# Altium footprint library komponenty_ITS_v1.PcbLib: 81 footprints (part 3 of 6) (continued)
## Mini-Flat_4 [mm] (continued)

## Mini-Flat_4_10mm [mm] "10mm version"
pads (4):
  rect 3x0.8 smd: 1(-4.5,1.27) 2(-4.5,-1.27) 3(4.5,-1.27) 4(4.5,1.27)
Top Overlay:
  circle w0.508: c-3.3,2.35 r0.105
  circle w0.508: c-1.25,1.95 r0.114
  lines w0.152: -1.829,-2.5 1.727,-2.5 1.727,2.5 -1.829,2.5 -1.829,-2.5
Mechanical 7:
  lines w0.2: -3,0 3,0
Top M11-12_SMOT:
  circle w0.508: c-1.9,1.3 r0.114
  rectangle: -4.15,-1.6 -2.45,-0.953
  rectangle: -4.15,0.95 -2.45,1.597
  region: 4.1,-0.953 2.4,-0.953 2.4,-1.6 4.1,-1.6
  region: 4.1,1.597 2.4,1.597 2.4,0.95 4.1,0.95
  lines w0.1: -2.45,-2.45 -2.45,2.45 2.45,2.45 2.45,-2.45 -2.45,-2.45
Top M13-14_SDES:
  text "'.Designator'" at -4.532,-0.333 h0.8
M15_orgin:
  lines w0.15: -1.194,0 0,0 ; 0,-1.194 0,0 ; 0,1.194 0,0 ; 1.194,0 0,0 ; -6.25,-2.55 -6.25,2.55 6.25,2.55 6.25,-2.55 -6.25,-2.55
3D body "Mini-FlatPackage_4.STEP": height 2, standoff -0.1, extent -3.525,-1.8 3.475,1.8

## PIN_HEADER_1x2_2.54_THT_A001 [mm]
pads (2):
  oval 1.6x1.8 hole 0.9: 1(-1.27,0) 2(1.27,0)
Top Overlay:
  lines w0.2: -2.603,0.893 -2.203,1.293 2.197,1.293 2.597,0.893 ; -2.6,-0.9 -2.2,-1.3 2.2,-1.3 2.6,-0.9
M15_orgin:
  lines w0.1: -1,0 0,0 ; 0,-1 0,0 ; 0,1 0,0 ; 0.009,0.004 1.009,0.004 ; -2.6,-1.3 2.6,-1.3 2.6,1.3 -2.6,1.3 -2.6,-1.3
Top M17-18_TDES:
  text "'.Designator'" at -5.465,2.483 h1
Top M19-20_TMOT:
  circle w0.3: c-2.1,-0.7 r0.15
  lines w0.15: 2.578,-0.823 2.102,-1.3 0.6,-1.3 0,-0.7 -0.6,-1.3 -2.2,-1.3 -2.6,-0.9 -2.6,0.823 -2.123,1.3 -0.6,1.3 0,0.7 0.6,1.3 2.2,1.3 2.579,0.921 2.579,-0.823 ; -1.708,-0.412 -1.708,0.388 ; -1.708,-0.412 -0.908,0.388 ; -1.708,-0.412 -0.908,-0.412 ; -1.708,0.388 -0.908,-0.412 ; -1.708,0.388 -0.908,0.388 ; -0.908,-0.412 -0.908,0.388 ; 0.875,-0.406 0.875,0.394 ; 0.875,-0.406 1.675,0.394 ; 0.875,-0.406 1.675,-0.406 ; 0.875,0.394 1.675,-0.406 ; 0.875,0.394 1.675,0.394 ; 1.675,-0.406 1.675,0.394 ; -2.8,-1.5 2.8,-1.5 2.8,1.5 -2.8,1.5 -2.8,-1.5
3D body "pin_header_1x2_2mm_THT.stp": height 8.55, standoff -2.99, extent -2.54,-1.27 2.54,1.27

## PIN_HEADER_1x2_2_THT_A001 [mm]
pads (2):
  oval 1.5x1.7 hole 0.8: 1(-1,0) 2(1,0)
Top Overlay:
  lines w0.2: -2.2,-0.5 -2.2,0.6 ; 2.2,-0.5 2.2,0.6
M15_orgin:
  lines w0.1: -2.204,-0.999 2.196,-0.999 ; -2.2,-0.995 -2.2,1 2.2,1 2.2,-0.995 ; -1,0 0,0 ; 0,-1 0,0 ; 0,1 0,0 ; 0.009,0.004 1.009,0.004
Top M17-18_TDES:
  text "'.Designator'" at -5.565,1.733 h1
Top M19-20_TMOT:
  circle w0.3: c-1.1,-1.4 r0.15
  lines w0.15: -1.4,-0.4 -1.4,0.4 ; -1.4,-0.4 -0.6,0.4 ; -1.4,-0.4 -0.6,-0.4 ; -1.4,0.4 -0.6,-0.4 ; -1.4,0.4 -0.6,0.4 ; -0.6,-0.4 -0.6,0.4 ; 0.6,-0.4 0.6,0.4 ; 0.6,-0.4 1.4,0.4 ; 0.6,-0.4 1.4,-0.4 ; 0.6,0.4 1.4,-0.4 ; 0.6,0.4 1.4,0.4 ; 1.4,-0.4 1.4,0.4 ; -2.15,-0.75 -2.15,0.75 -1.95,0.95 -0.25,0.95 0,0.7 0.25,0.95 1.9,0.95 2.15,0.7 2.15,-0.7 1.9,-0.95 0.25,-0.95 0,-0.7 -0.25,-0.95 -1.95,-0.95 -2.15,-0.75
3D body "2pin_jumper_62000211121.stp": height 6.01, standoff -2.69, extent -2,-1 2,1

## PWSON-10 [mm]
height 0.8
pads (19):
  rrect50% 0.28x0.9 smd: 1(-1,-1.55) 2(-0.5,-1.55) 3(0,-1.55) 4(0.5,-1.55) 5(1,-1.55) 6(1,1.55) 7(0.5,1.55) 8(0,1.55) 9(-0.5,1.55) 10(-1,1.55)
  rect 0.7x0.25 smd paste-0.2: EP1(-1.5,0.6) EP2(-1.5,0.2) EP3(-1.5,-0.2) EP4(-1.5,-0.6) EP5(1.5,-0.6) EP6(1.5,-0.2) EP7(1.5,0.2) EP8(1.5,0.6)
  rect 2.35x1.7 smd paste-1.2: EP9(0,0)
Top Overlay:
  circle w0.25: c-1.7,-2.3 r0.125
  lines w0.2: -1.725,-1.29 -1.725,-1.725 -1.54,-1.725 ; -1.725,1.29 -1.725,1.725 -1.54,1.725 ; 1.54,-1.725 1.725,-1.725 1.725,-1.29 ; 1.54,1.725 1.725,1.725 1.725,1.29
Top Paste:
  rectangle: -1.79,-0.719 -1.204,-0.477
  rectangle: -1.79,-0.319 -1.204,-0.077
  rectangle: -1.79,0.081 -1.204,0.323
  rectangle: -1.79,0.481 -1.204,0.723
  rectangle: 1.21,-0.719 1.796,-0.477
  rectangle: 1.21,-0.319 1.796,-0.077
  rectangle: 1.21,0.081 1.796,0.323
  rectangle: 1.21,0.481 1.796,0.723
  rectangle: -0.988,-0.7 -0.1,-0.1
  region: 0.988,0.7 0.1,0.7 0.1,0.1 0.988,0.1
  region: 0.988,-0.1 0.1,-0.1 0.1,-0.7 0.988,-0.7
  rectangle: -0.988,0.1 -0.1,0.7
Top Solder:
  rectangle: -1.149,0.638 1.177,1.406
  rectangle: -1.174,-1.243 1.168,-0.676
  rectangle: -1,-2.1 1,-1
  rectangle: -1,1 1,2.1
  lines w0.2: -1.594,-0.725 cw(c-1.594,-1.175) -1.144,-1.175 ; -1.589,0.722 ccw(c-1.589,1.172) -1.139,1.172 ; 1.139,-1.172 cw(c1.589,-1.172) 1.589,-0.722 ; 1.141,1.186 ccw(c1.591,1.186) 1.591,0.736
Top M11-12_SMOT:
  circle w0.25: c-1.292,-1.025 r0.125
  region: -0.317,-1.381 -0.688,-1.381 -0.688,-1.6 -0.317,-1.6
  region: -0.817,-1.381 -1.188,-1.381 -1.188,-1.6 -0.817,-1.6
  region: -1.474,-0.32 -1.474,-0.071 -1.692,-0.071 -1.692,-0.32
  region: -1.474,-0.72 -1.474,-0.471 -1.692,-0.471 -1.692,-0.72
  rectangle: -1.183,1.381 -0.812,1.6
  rectangle: -0.683,1.381 -0.312,1.6
  region: -1.474,0.48 -1.474,0.729 -1.692,0.729 -1.692,0.48
  region: -1.474,0.08 -1.474,0.329 -1.692,0.329 -1.692,0.08
  region: 1.183,-1.381 0.812,-1.381 0.812,-1.6 1.183,-1.6
  region: 0.683,-1.381 0.312,-1.381 0.312,-1.6 0.683,-1.6
  region: 1.474,-0.08 1.474,-0.329 1.692,-0.329 1.692,-0.08
  region: 1.474,-0.48 1.474,-0.729 1.692,-0.729 1.692,-0.48
  rectangle: 0.317,1.381 0.688,1.6
  rectangle: 0.817,1.381 1.188,1.6
  region: 1.474,0.72 1.474,0.471 1.692,0.471 1.692,0.72
  region: 1.474,0.32 1.474,0.071 1.692,0.071 1.692,0.32
  region: 0.183,-1.381 -0.188,-1.381 -0.188,-1.6 0.183,-1.6
  rectangle: -0.183,1.381 0.188,1.6
  lines w0.1: -1.7,-1.6 -1.7,1.6 1.7,1.6 1.7,-1.6 -1.7,-1.6
Top M13-14_SDES:
  text "'.Designator'" at -4.532,-0.333 h0.8
M15_orgin:
  lines w0.1: -0.5,0 0.5,0 ; 0,-0.5 0,0.5 ; -1.575,-1.575 -1.575,1.575 1.575,1.575 1.575,-1.575 -1.575,-1.575
3D body "PWSON-10.step": height 0.8, standoff 0, extent -1.576,-1.576 1.576,1.576

## QFN48_5_5_v1 [mm] "QFN48 5x5"
height 0.9
pads (49):
  oval 0.8x0.2 smd: 1(-2.425,2.275) 2(-2.425,1.925) 3(-2.425,1.575) 4(-2.425,1.225) 5(-2.425,0.875) 6(-2.425,0.525) 7(-2.425,0.175) 8(-2.425,-0.175) 9(-2.425,-0.525) 10(-2.425,-0.875) 11(-2.425,-1.225) 12(-2.425,-1.575) 13(-2.425,-1.925) 14(-2.425,-2.275) 25(2.425,-2.275) 26(2.425,-1.925) 27(2.425,-1.575) 28(2.425,-1.225) 29(2.425,-0.875) 30(2.425,-0.525) 31(2.425,-0.175) 32(2.425,0.175) 33(2.425,0.525) 34(2.425,0.875) 35(2.425,1.225) 36(2.425,1.575) 37(2.425,1.925) 38(2.425,2.275)
  oval 0.2x0.8 smd: 15(-1.575,-2.425) 16(-1.225,-2.425) 17(-0.875,-2.425) 18(-0.525,-2.425) 19(-0.175,-2.425) 20(0.175,-2.425) 21(0.525,-2.425) 22(0.875,-2.425) 23(1.225,-2.425) 24(1.575,-2.425)
  oval 0.2x0.8 smd paste-0.1: 39(1.575,2.425) 40(1.225,2.425) 41(0.875,2.425) 42(0.525,2.425) 43(0.175,2.425) 44(-0.175,2.425) 45(-0.525,2.425) 46(-0.875,2.425) 47(-1.225,2.425) 48(-1.575,2.425)
  rect 3.7x3.7 smd paste-1.85: 49(0,0)
Top Overlay:
  circle w0.25: c-2.975,2.975 r0.125
Top Paste:
  rectangle: -1.6,0.2 -0.2,1.6
  region: -0.21,-1.593 -0.21,-0.193 -1.61,-0.193 -1.61,-1.593
  region: 1.584,-0.187 0.184,-0.187 0.184,-1.587 1.584,-1.587
  region: 0.2,1.6 0.2,0.2 1.6,0.2 1.6,1.6
  lines w0.2: -1.576,2.42 -1.576,2.72 ; -1.224,2.13 -1.224,2.43 ; -0.876,2.42 -0.876,2.72 ; -0.524,2.13 -0.524,2.43 ; -0.176,2.42 -0.176,2.72 ; 0.176,2.13 0.176,2.43 ; 0.524,2.42 0.524,2.72 ; 0.876,2.13 0.876,2.43 ; 1.224,2.42 1.224,2.72 ; 1.576,2.13 1.576,2.43
Top M11-12_SMOT:
  circle w0.2: c-1.625,1.625 r0.2
  rectangle: -1.65,2.15 -1.5,2.603
  rectangle: -1.3,2.15 -1.15,2.603
  rectangle: -0.95,2.15 -0.8,2.603
  rectangle: -0.6,2.15 -0.45,2.603
  rectangle: -0.25,2.15 -0.1,2.603
  rectangle: 0.1,2.15 0.25,2.603
  rectangle: 0.45,2.15 0.6,2.603
  rectangle: 0.8,2.15 0.95,2.603
  rectangle: 1.15,2.15 1.3,2.603
  rectangle: 1.5,2.15 1.65,2.603
  region: 2.15,2.35 2.15,2.2 2.603,2.2 2.603,2.35
  region: 2.15,2 2.15,1.85 2.603,1.85 2.603,2
  region: 2.15,1.65 2.15,1.5 2.603,1.5 2.603,1.65
  region: 2.15,1.3 2.15,1.15 2.603,1.15 2.603,1.3
  region: 2.15,0.95 2.15,0.8 2.603,0.8 2.603,0.95
  region: 2.15,0.6 2.15,0.45 2.603,0.45 2.603,0.6
  region: 2.15,0.25 2.15,0.1 2.603,0.1 2.603,0.25
  region: 2.15,-0.1 2.15,-0.25 2.603,-0.25 2.603,-0.1
  region: 2.15,-0.45 2.15,-0.6 2.603,-0.6 2.603,-0.45
  region: 2.15,-0.8 2.15,-0.95 2.603,-0.95 2.603,-0.8
  region: 2.15,-1.15 2.15,-1.3 2.603,-1.3 2.603,-1.15
  region: 2.15,-1.5 2.15,-1.65 2.603,-1.65 2.603,-1.5
  region: 2.15,-1.85 2.15,-2 2.603,-2 2.603,-1.85
  region: 2.15,-2.2 2.15,-2.35 2.603,-2.35 2.603,-2.2
  region: 1.65,-2.15 1.5,-2.15 1.5,-2.603 1.65,-2.603
  region: 1.3,-2.15 1.15,-2.15 1.15,-2.603 1.3,-2.603
  region: 0.95,-2.15 0.8,-2.15 0.8,-2.603 0.95,-2.603
  region: 0.6,-2.15 0.45,-2.15 0.45,-2.603 0.6,-2.603
  region: 0.25,-2.15 0.1,-2.15 0.1,-2.603 0.25,-2.603
  region: -0.1,-2.15 -0.25,-2.15 -0.25,-2.603 -0.1,-2.603
  region: -0.45,-2.15 -0.6,-2.15 -0.6,-2.603 -0.45,-2.603
  region: -0.8,-2.15 -0.95,-2.15 -0.95,-2.603 -0.8,-2.603
  region: -1.15,-2.15 -1.3,-2.15 -1.3,-2.603 -1.15,-2.603
  region: -1.5,-2.15 -1.65,-2.15 -1.65,-2.603 -1.5,-2.603
  region: -2.15,-2.35 -2.15,-2.2 -2.603,-2.2 -2.603,-2.35
  region: -2.15,-2 -2.15,-1.85 -2.603,-1.85 -2.603,-2
  region: -2.15,-1.65 -2.15,-1.5 -2.603,-1.5 -2.603,-1.65
  region: -2.15,-1.3 -2.15,-1.15 -2.603,-1.15 -2.603,-1.3
  region: -2.15,-0.95 -2.15,-0.8 -2.603,-0.8 -2.603,-0.95
  region: -2.15,-0.6 -2.15,-0.45 -2.603,-0.45 -2.603,-0.6
  region: -2.15,-0.25 -2.15,-0.1 -2.603,-0.1 -2.603,-0.25
  region: -2.15,0.1 -2.15,0.25 -2.603,0.25 -2.603,0.1
  region: -2.15,0.45 -2.15,0.6 -2.603,0.6 -2.603,0.45
  region: -2.15,0.8 -2.15,0.95 -2.603,0.95 -2.603,0.8
  region: -2.15,1.15 -2.15,1.3 -2.603,1.3 -2.603,1.15
  region: -2.15,1.5 -2.15,1.65 -2.603,1.65 -2.603,1.5
  region: -2.15,1.85 -2.15,2 -2.603,2 -2.603,1.85
  region: -2.15,2.2 -2.15,2.35 -2.603,2.35 -2.603,2.2
  lines w0.1: -2.6,-2.6 -2.6,2.6 2.6,2.6 2.6,-2.6 -2.6,-2.6
Top M13-14_SDES:
  text "'.Designator'" at -4.532,-0.333 h0.8
M15_orgin:
  lines w0.05: -3.075,-3.075 -3.075,3.075 3.075,3.075 3.075,-3.075 -3.075,-3.075
  lines w0.1: -0.5,0 0.5,0 ; 0,-0.5 0,0.5
3D body "QFN48_5_5_v1.step": height 0.9, standoff 0, extent -2.575,-2.575 2.575,2.575

## QFN64_A001 [mm] "GECO SILICON LABS"
height 0.8
pads (65):
  rrect50% 0.8x0.25 smd paste-0.126: 1(-4.425,3.75) 16(-4.425,-3.75) 33(4.425,-3.75) 48(4.425,3.75)
  rrect50% 0.85x0.25 smd paste-0.126: 2(-4.4,3.25) 3(-4.4,2.75) 4(-4.4,2.25) 5(-4.4,1.75) 6(-4.4,1.25) 7(-4.4,0.75) 8(-4.4,0.25) 9(-4.4,-0.25) 10(-4.4,-0.75) 11(-4.4,-1.25) 12(-4.4,-1.75) 13(-4.4,-2.25) 14(-4.4,-2.75) 15(-4.4,-3.25) 34(4.4,-3.25) 35(4.4,-2.75) 36(4.4,-2.25) 37(4.4,-1.75) 38(4.4,-1.25) 39(4.4,-0.75) 40(4.4,-0.25) 41(4.4,0.25) 42(4.4,0.75) 43(4.4,1.25) 44(4.4,1.75) 45(4.4,2.25) 46(4.4,2.75) 47(4.4,3.25)
  rrect50% 0.25x0.8 smd paste-0.126: 17(-3.75,-4.425) 32(3.75,-4.425) 49(3.75,4.425) 64(-3.75,4.425)
  rrect50% 0.25x0.85 smd paste-0.126: 18(-3.25,-4.4) 19(-2.75,-4.4) 20(-2.25,-4.4) 21(-1.75,-4.4) 22(-1.25,-4.4) 23(-0.75,-4.4) 24(-0.25,-4.4) 25(0.25,-4.4) 26(0.75,-4.4) 27(1.25,-4.4) 28(1.75,-4.4) 29(2.25,-4.4) 30(2.75,-4.4) 31(3.25,-4.4) 50(3.25,4.4) 51(2.75,4.4) 52(2.25,4.4) 53(1.75,4.4) 54(1.25,4.4) 55(0.75,4.4) 56(0.25,4.4) 57(-0.25,4.4) 58(-0.75,4.4) 59(-1.25,4.4) 60(-1.75,4.4) 61(-2.25,4.4) 62(-2.75,4.4) 63(-3.25,4.4)
  rect 7.2x7.2 smd paste-3.7: 65(0,0)
Top Overlay:
  circle w0.25: c-5.3,4.5 r0.125
  lines w0.2: -4.65,-4.275 -4.65,-4.65 -4.275,-4.65 ; -4.65,4.275 -4.65,4.65 -4.275,4.65 ; 4.275,-4.65 4.65,-4.65 4.65,-4.275 ; 4.275,4.65 4.65,4.65 4.65,4.275
Top Paste:
  drawing of 70 lines, arcs and shapes, not listed
Top M11-12_SMOT:
  circle w0.2: c-3.5,3.5 r0.2
  rectangle: -3.842,4.138 -3.67,4.591
  rectangle: -3.34,4.134 -3.168,4.587
  rectangle: -2.84,4.134 -2.668,4.587
  rectangle: -2.34,4.134 -2.168,4.587
  rectangle: -1.84,4.134 -1.668,4.587
  rectangle: -1.34,4.134 -1.168,4.587
  rectangle: -0.84,4.134 -0.668,4.587
  rectangle: -0.34,4.134 -0.168,4.587
  rectangle: 0.16,4.134 0.332,4.587
  rectangle: 0.66,4.134 0.832,4.587
  rectangle: 1.16,4.134 1.332,4.587
  rectangle: 1.66,4.134 1.832,4.587
  rectangle: 2.16,4.134 2.332,4.587
  rectangle: 2.66,4.134 2.832,4.587
  rectangle: 3.16,4.134 3.332,4.587
  rectangle: 3.667,4.137 3.838,4.59
  region: -4.138,-3.842 -4.138,-3.67 -4.591,-3.67 -4.591,-3.842
  region: -4.134,-3.34 -4.134,-3.168 -4.587,-3.168 -4.587,-3.34
  region: -4.134,-2.84 -4.134,-2.668 -4.587,-2.668 -4.587,-2.84
  region: -4.134,-2.34 -4.134,-2.168 -4.587,-2.168 -4.587,-2.34
  region: -4.134,-1.84 -4.134,-1.668 -4.587,-1.668 -4.587,-1.84
  region: -4.134,-1.34 -4.134,-1.168 -4.587,-1.168 -4.587,-1.34
  region: -4.134,-0.84 -4.134,-0.668 -4.587,-0.668 -4.587,-0.84
  region: -4.134,-0.34 -4.134,-0.168 -4.587,-0.168 -4.587,-0.34
  region: -4.134,0.16 -4.134,0.332 -4.587,0.332 -4.587,0.16
  region: -4.134,0.66 -4.134,0.832 -4.587,0.832 -4.587,0.66
  region: -4.134,1.16 -4.134,1.332 -4.587,1.332 -4.587,1.16
  region: -4.134,1.66 -4.134,1.832 -4.587,1.832 -4.587,1.66
  region: -4.134,2.16 -4.134,2.332 -4.587,2.332 -4.587,2.16
  region: -4.134,2.66 -4.134,2.832 -4.587,2.832 -4.587,2.66
  region: -4.134,3.16 -4.134,3.332 -4.587,3.332 -4.587,3.16
  region: -4.137,3.667 -4.137,3.838 -4.59,3.838 -4.59,3.667
  region: 3.842,-4.138 3.67,-4.138 3.67,-4.591 3.842,-4.591
  region: 3.34,-4.134 3.168,-4.134 3.168,-4.587 3.34,-4.587
  region: 2.84,-4.134 2.668,-4.134 2.668,-4.587 2.84,-4.587
  region: 2.34,-4.134 2.168,-4.134 2.168,-4.587 2.34,-4.587
  region: 1.84,-4.134 1.668,-4.134 1.668,-4.587 1.84,-4.587
  region: 1.34,-4.134 1.168,-4.134 1.168,-4.587 1.34,-4.587
  region: 0.84,-4.134 0.668,-4.134 0.668,-4.587 0.84,-4.587
  region: 0.34,-4.134 0.168,-4.134 0.168,-4.587 0.34,-4.587
  region: -0.16,-4.134 -0.332,-4.134 -0.332,-4.587 -0.16,-4.587
  region: -0.66,-4.134 -0.832,-4.134 -0.832,-4.587 -0.66,-4.587
  region: -1.16,-4.134 -1.332,-4.134 -1.332,-4.587 -1.16,-4.587
  region: -1.66,-4.134 -1.832,-4.134 -1.832,-4.587 -1.66,-4.587
  region: -2.16,-4.134 -2.332,-4.134 -2.332,-4.587 -2.16,-4.587
  region: -2.66,-4.134 -2.832,-4.134 -2.832,-4.587 -2.66,-4.587
  region: -3.16,-4.134 -3.332,-4.134 -3.332,-4.587 -3.16,-4.587
  region: -3.667,-4.137 -3.838,-4.137 -3.838,-4.59 -3.667,-4.59
  region: 4.138,3.842 4.138,3.67 4.591,3.67 4.591,3.842
  region: 4.134,3.34 4.134,3.168 4.587,3.168 4.587,3.34
  region: 4.134,2.84 4.134,2.668 4.587,2.668 4.587,2.84
  region: 4.134,2.34 4.134,2.168 4.587,2.168 4.587,2.34
  region: 4.134,1.84 4.134,1.668 4.587,1.668 4.587,1.84
  region: 4.134,1.34 4.134,1.168 4.587,1.168 4.587,1.34
  region: 4.134,0.84 4.134,0.668 4.587,0.668 4.587,0.84
  region: 4.134,0.34 4.134,0.168 4.587,0.168 4.587,0.34
  region: 4.134,-0.16 4.134,-0.332 4.587,-0.332 4.587,-0.16
  region: 4.134,-0.66 4.134,-0.832 4.587,-0.832 4.587,-0.66
  region: 4.134,-1.16 4.134,-1.332 4.587,-1.332 4.587,-1.16
  region: 4.134,-1.66 4.134,-1.832 4.587,-1.832 4.587,-1.66
  region: 4.134,-2.16 4.134,-2.332 4.587,-2.332 4.587,-2.16
  region: 4.134,-2.66 4.134,-2.832 4.587,-2.832 4.587,-2.66
  region: 4.134,-3.16 4.134,-3.332 4.587,-3.332 4.587,-3.16
  region: 4.137,-3.667 4.137,-3.838 4.59,-3.838 4.59,-3.667
  lines w0.1: -4.5,-4.5 4.5,-4.5 4.5,4.5 -4.5,4.5 -4.5,-4.5
Top M13-14_SDES:
  text "'.Designator'" at -4.532,-0.333 h0.8
M15_orgin:
  lines w0.05: -5,-5 -5,5 5,5 5,-5 -5,-5
  lines w0.1: -0.5,0 0.5,0 ; 0,-0.5 0,0.5
3D body "QFN64_A001.step": height 0.8, standoff 0, extent -4.55,-4.55 4.55,4.55

## QFN_16_3x3_A001 [mm] "CMOSTEK"
height 0.8
pads (17):
  oval 0.7x0.25 smd paste-0.05 mask+0.1: 1(-1.35,0.75) 2(-1.35,0.25) 3(-1.35,-0.25) 4(-1.35,-0.75) 9(1.35,-0.75) 10(1.35,-0.25) 11(1.35,0.25) 12(1.35,0.75)
  oval 0.25x0.7 smd paste-0.05 mask+0.1: 5(-0.75,-1.35) 6(-0.25,-1.35) 7(0.25,-1.35) 8(0.75,-1.35) 13(0.75,1.35) 14(0.25,1.35) 15(-0.25,1.35) 16(-0.75,1.35)
  rect 1.6x1.6 smd paste-0.1 mask+0.1: 17(0,0)
Top Overlay:
  circle w0.25: c-2.35,1.55 r0.125
  lines w0.2: -1.7,-1.275 -1.7,-1.7 -1.275,-1.7 ; -1.7,1.275 -1.7,1.7 -1.275,1.7 ; 1.275,-1.7 1.7,-1.7 1.7,-1.275 ; 1.275,1.7 1.7,1.7 1.7,1.275
Top Solder:
  rectangle: 0.8,-0.8 1.8,0.8
  region: 0.8,0.8 0.8,1.8 -0.8,1.8 -0.8,0.8
  region: -0.8,0.8 -1.8,0.8 -1.8,-0.8 -0.8,-0.8
  region: -0.8,-0.8 -0.8,-1.8 0.8,-1.8 0.8,-0.8
  region: 0.974,1.118 0.974,1.114 0.976,1.088 0.997,1.038 1.035,1.001 1.084,0.98 1.111,0.978 1.1,0.978 1.1,0.7 0.6,0.7 0.6,1.119
  region: -1.118,0.974 -1.114,0.974 -1.088,0.976 -1.038,0.997 -1.001,1.035 -0.98,1.084 -0.978,1.111 -0.978,1.1 -0.7,1.1 -0.7,0.6 -1.119,0.6
  region: -0.974,-1.118 -0.974,-1.114 -0.976,-1.088 -0.997,-1.038 -1.035,-1.001 -1.084,-0.98 -1.111,-0.978 -1.1,-0.978 -1.1,-0.7 -0.6,-0.7 -0.6,-1.119
  region: 1.118,-0.974 1.114,-0.974 1.088,-0.976 1.038,-0.997 1.001,-1.035 0.98,-1.084 0.978,-1.111 0.978,-1.1 0.7,-1.1 0.7,-0.6 1.119,-0.6
Top M11-12_SMOT:
  circle w0.25: c-1.2,1.2 r0.125
  rectangle: -0.85,1.24 -0.65,1.575
  rectangle: -0.35,1.24 -0.15,1.575
  rectangle: 0.15,1.24 0.35,1.575
  rectangle: 0.65,1.24 0.85,1.575
  region: 1.24,0.85 1.24,0.65 1.575,0.65 1.575,0.85
  region: 1.24,0.35 1.24,0.15 1.575,0.15 1.575,0.35
  region: 1.24,-0.15 1.24,-0.35 1.575,-0.35 1.575,-0.15
  region: 1.24,-0.65 1.24,-0.85 1.575,-0.85 1.575,-0.65
  region: 0.85,-1.24 0.65,-1.24 0.65,-1.575 0.85,-1.575
  region: 0.35,-1.24 0.15,-1.24 0.15,-1.575 0.35,-1.575
  region: -0.15,-1.24 -0.35,-1.24 -0.35,-1.575 -0.15,-1.575
  region: -0.65,-1.24 -0.85,-1.24 -0.85,-1.575 -0.65,-1.575
  region: -1.24,-0.85 -1.24,-0.65 -1.575,-0.65 -1.575,-0.85
  region: -1.24,-0.35 -1.24,-0.15 -1.575,-0.15 -1.575,-0.35
  region: -1.24,0.15 -1.24,0.35 -1.575,0.35 -1.575,0.15
  region: -1.24,0.65 -1.24,0.85 -1.575,0.85 -1.575,0.65
  lines w0.2: -1.6,-1.6 1.6,-1.6 1.6,1.6 -1.6,1.6 -1.6,-1.6
Top M13-14_SDES:
  text "'.Designator'" at -4.532,-0.333 h0.8
M15_orgin:
  lines w0.05: -2.1,-2.1 2.1,-2.1 2.1,2.1 -2.1,2.1 -2.1,-2.1
  lines w0.1: -0.5,0 0.5,0 ; 0,-0.5 0,0.5
3D body "QFN_16_3x3_A001.step": height 0.8, standoff 0, extent -1.6,-1.6 1.6,1.6

## QFN_48_7x7_A001B [mm] "ST"
height 0.8
pads (49):
  rrect50% 0.55x0.3 smd paste-0.035 mask+0.1: 1(-3.375,2.75) 2(-3.375,2.25) 3(-3.375,1.75) 4(-3.375,1.25) 5(-3.375,0.75) 6(-3.375,0.25) 7(-3.375,-0.25) 8(-3.375,-0.75) 9(-3.375,-1.25) 10(-3.375,-1.75) 11(-3.375,-2.25) 12(-3.375,-2.75) 25(3.375,-2.75) 26(3.375,-2.25) 27(3.375,-1.75) 28(3.375,-1.25) 29(3.375,-0.75) 30(3.375,-0.25) 31(3.375,0.25) 32(3.375,0.75) 33(3.375,1.25) 34(3.375,1.75) 35(3.375,2.25) 36(3.375,2.75)
  rrect50% 0.3x0.55 smd paste-0.035 mask+0.1: 13(-2.75,-3.375) 14(-2.25,-3.375) 15(-1.75,-3.375) 16(-1.25,-3.375) 17(-0.75,-3.375) 18(-0.25,-3.375) 19(0.25,-3.375) 20(0.75,-3.375) 21(1.25,-3.375) 22(1.75,-3.375) 23(2.25,-3.375) 24(2.75,-3.375) 37(2.75,3.375) 38(2.25,3.375) 39(1.75,3.375) 40(1.25,3.375) 41(0.75,3.375) 42(0.25,3.375) 43(-0.25,3.375) 44(-0.75,3.375) 45(-1.25,3.375) 46(-1.75,3.375) 47(-2.25,3.375) 48(-2.75,3.375)
  rect 5.5x5.5 smd paste-2.75 mask+0.1: 49(0,0)
Top Overlay:
  circle w0.25: c-4.215,3.496 r0.125
  lines w0.2: -3.713,3.325 -3.713,3.75 -3.288,3.75 ; -3.7,-3.275 -3.7,-3.7 -3.275,-3.7 ; 3.287,-3.75 3.712,-3.75 3.712,-3.325 ; 3.325,3.712 3.75,3.712 3.75,3.287
Top Paste:
  region: -0.75,0.75 -0.75,-0.75 0.75,-0.75 0.75,0.75
  region: 1.25,0.75 1.25,-0.75 2.5,-0.75 2.5,0.75
  region: 0.75,-1.25 -0.75,-1.25 -0.75,-2.5 0.75,-2.5
  region: -1.25,-0.75 -1.25,0.75 -2.5,0.75 -2.5,-0.75
  rectangle: -0.75,1.25 0.75,2.5
  region: 1.25,2.5 1.25,1.25 2.5,1.25 2.5,2.5
  region: 2.5,-1.25 1.25,-1.25 1.25,-2.5 2.5,-2.5
  region: -1.25,-2.5 -1.25,-1.25 -2.5,-1.25 -2.5,-2.5
  rectangle: -2.5,1.25 -1.25,2.5
Top Solder:
  region: -0.8,-0.8 -0.8,-1.8 0.8,-1.8 0.8,-0.8
  region: -0.8,0.8 -1.8,0.8 -1.8,-0.8 -0.8,-0.8
  region: 0.8,0.8 0.8,1.8 -0.8,1.8 -0.8,0.8
  rectangle: 0.8,-0.8 1.8,0.8
  region: 1.118,-0.974 1.114,-0.974 1.088,-0.976 1.038,-0.997 1.001,-1.035 0.98,-1.084 0.978,-1.111 0.978,-1.1 0.7,-1.1 0.7,-0.6 1.119,-0.6
  region: -0.974,-1.118 -0.974,-1.114 -0.976,-1.088 -0.997,-1.038 -1.035,-1.001 -1.084,-0.98 -1.111,-0.978 -1.1,-0.978 -1.1,-0.7 -0.6,-0.7 -0.6,-1.119
  region: -1.118,0.974 -1.114,0.974 -1.088,0.976 -1.038,0.997 -1.001,1.035 -0.98,1.084 -0.978,1.111 -0.978,1.1 -0.7,1.1 -0.7,0.6 -1.119,0.6
  region: 0.974,1.118 0.974,1.114 0.976,1.088 0.997,1.038 1.035,1.001 1.084,0.98 1.111,0.978 1.1,0.978 1.1,0.7 0.6,0.7 0.6,1.119
Top M11-12_SMOT:
  circle w0.25: c-2.75,2.75 r0.125
  region: -3.171,-2.85 -3.171,-2.65 -3.62,-2.65 -3.62,-2.85
  region: -3.171,-2.35 -3.171,-2.15 -3.62,-2.15 -3.62,-2.35
  region: -3.171,-1.85 -3.171,-1.65 -3.62,-1.65 -3.62,-1.85
  region: -3.171,-1.35 -3.171,-1.15 -3.62,-1.15 -3.62,-1.35
  region: -3.171,-0.85 -3.171,-0.65 -3.62,-0.65 -3.62,-0.85
  region: -3.171,-0.35 -3.171,-0.15 -3.62,-0.15 -3.62,-0.35
  region: -3.171,0.15 -3.171,0.35 -3.62,0.35 -3.62,0.15
  region: -3.171,0.65 -3.171,0.85 -3.62,0.85 -3.62,0.65
  region: -3.171,1.15 -3.171,1.35 -3.62,1.35 -3.62,1.15
  region: -3.171,1.65 -3.171,1.85 -3.62,1.85 -3.62,1.65
  region: -3.171,2.15 -3.171,2.35 -3.62,2.35 -3.62,2.15
  region: -3.171,2.65 -3.171,2.85 -3.62,2.85 -3.62,2.65
  rectangle: -2.85,3.171 -2.65,3.62
  rectangle: -2.35,3.171 -2.15,3.62
  rectangle: -1.85,3.171 -1.65,3.62
  rectangle: -1.35,3.171 -1.15,3.62
  rectangle: -0.85,3.171 -0.65,3.62
  rectangle: -0.35,3.171 -0.15,3.62
  rectangle: 0.15,3.171 0.35,3.62
  rectangle: 0.65,3.171 0.85,3.62
  rectangle: 1.15,3.171 1.35,3.62
  rectangle: 1.65,3.171 1.85,3.62
  rectangle: 2.15,3.171 2.35,3.62
  rectangle: 2.65,3.171 2.85,3.62
  region: 3.171,2.85 3.171,2.65 3.62,2.65 3.62,2.85
  region: 3.171,2.35 3.171,2.15 3.62,2.15 3.62,2.35
  region: 3.171,1.85 3.171,1.65 3.62,1.65 3.62,1.85
  region: 3.171,1.35 3.171,1.15 3.62,1.15 3.62,1.35
  region: 3.171,0.85 3.171,0.65 3.62,0.65 3.62,0.85
  region: 3.171,0.35 3.171,0.15 3.62,0.15 3.62,0.35
  region: 3.171,-0.15 3.171,-0.35 3.62,-0.35 3.62,-0.15
  region: 3.171,-0.65 3.171,-0.85 3.62,-0.85 3.62,-0.65
  region: 3.171,-1.15 3.171,-1.35 3.62,-1.35 3.62,-1.15
  region: 3.171,-1.65 3.171,-1.85 3.62,-1.85 3.62,-1.65
  region: 3.171,-2.15 3.171,-2.35 3.62,-2.35 3.62,-2.15
  region: 3.171,-2.65 3.171,-2.85 3.62,-2.85 3.62,-2.65
  region: 2.85,-3.171 2.65,-3.171 2.65,-3.62 2.85,-3.62
  region: 2.35,-3.171 2.15,-3.171 2.15,-3.62 2.35,-3.62
  region: 1.85,-3.171 1.65,-3.171 1.65,-3.62 1.85,-3.62
  region: 1.35,-3.171 1.15,-3.171 1.15,-3.62 1.35,-3.62
  region: 0.85,-3.171 0.65,-3.171 0.65,-3.62 0.85,-3.62
  region: 0.35,-3.171 0.15,-3.171 0.15,-3.62 0.35,-3.62
  region: -0.15,-3.171 -0.35,-3.171 -0.35,-3.62 -0.15,-3.62
  region: -0.65,-3.171 -0.85,-3.171 -0.85,-3.62 -0.65,-3.62
  region: -1.15,-3.171 -1.35,-3.171 -1.35,-3.62 -1.15,-3.62
  region: -1.65,-3.171 -1.85,-3.171 -1.85,-3.62 -1.65,-3.62
  region: -2.15,-3.171 -2.35,-3.171 -2.35,-3.62 -2.15,-3.62
  region: -2.65,-3.171 -2.85,-3.171 -2.85,-3.62 -2.65,-3.62
  lines w0.2: -3.5,-3.5 -3.5,3.5 3.5,3.5 3.5,-3.5 -3.5,-3.5
Top M13-14_SDES:
  text "'.Designator'" at -4.532,-0.333 h0.8
M15_orgin:
  lines w0.05: -3.75,-3.75 -3.75,3.75 3.75,3.75 3.75,-3.75 -3.75,-3.75
  lines w0.1: -0.5,0 0.5,0 ; 0,-0.5 0,0.5
3D body "UFQFPN48.step": height 0.55, standoff 0, extent -3.5,-3.5 3.5,3.5

## SMA_THT_20mm_A001 [mm]
pads (5):
  round 2.5 hole 1.5: 1(0,0)
  round 3 hole 1.7: 2(-2.54,-2.54) 2(-2.54,2.54) 2(2.54,-2.54) 2(2.54,2.54)
M15_orgin:
  lines w0.2: -3.15,-3.95 -1.35,-3.95 16.55,-3.95 16.55,3.05 16.55,3.95 -3.15,3.95 -3.15,-3.95
Top M17-18_TDES:
  text "'.Designator'" at -4.583,-5.915 h1
Top M19-20_TMOT:
  lines w0.2: 3.5,-2.54 4.84,-2.54 5.4,-3.1 15.1,-3.1 15.66,-2.54 16.5,-2.54 16.5,2.5 ; 3.5,2.54 4.84,2.54 5.4,3.1 15.1,3.1 15.66,2.54 16.5,2.54 ; 5.12,-2.82 15.38,-2.82 ; 5.12,2.82 15.38,2.82 ; -3.5,-3.5 -3.5,3.5 3.5,3.5 3.5,-3.5 -3.5,-3.5
3D body "SMA_THT_20mm_60311042114502_rev1.STEP": height 10.47, standoff -3.93, extent -3.16,-3.96 16.53,3.96